# Altium footprint library MyPcbLib.PcbLib: 657 footprints (part 12 of 42)
Each footprint in its own frame and in the unit in brackets; x right, y up, seen from the top. Pads: shape width x height; smd on the part's side, far side on the other; paste and mask are expansions set on the pad; w line width, h text height; cw(c..) or ccw(c..) is an arc to the next point about the centre after c.
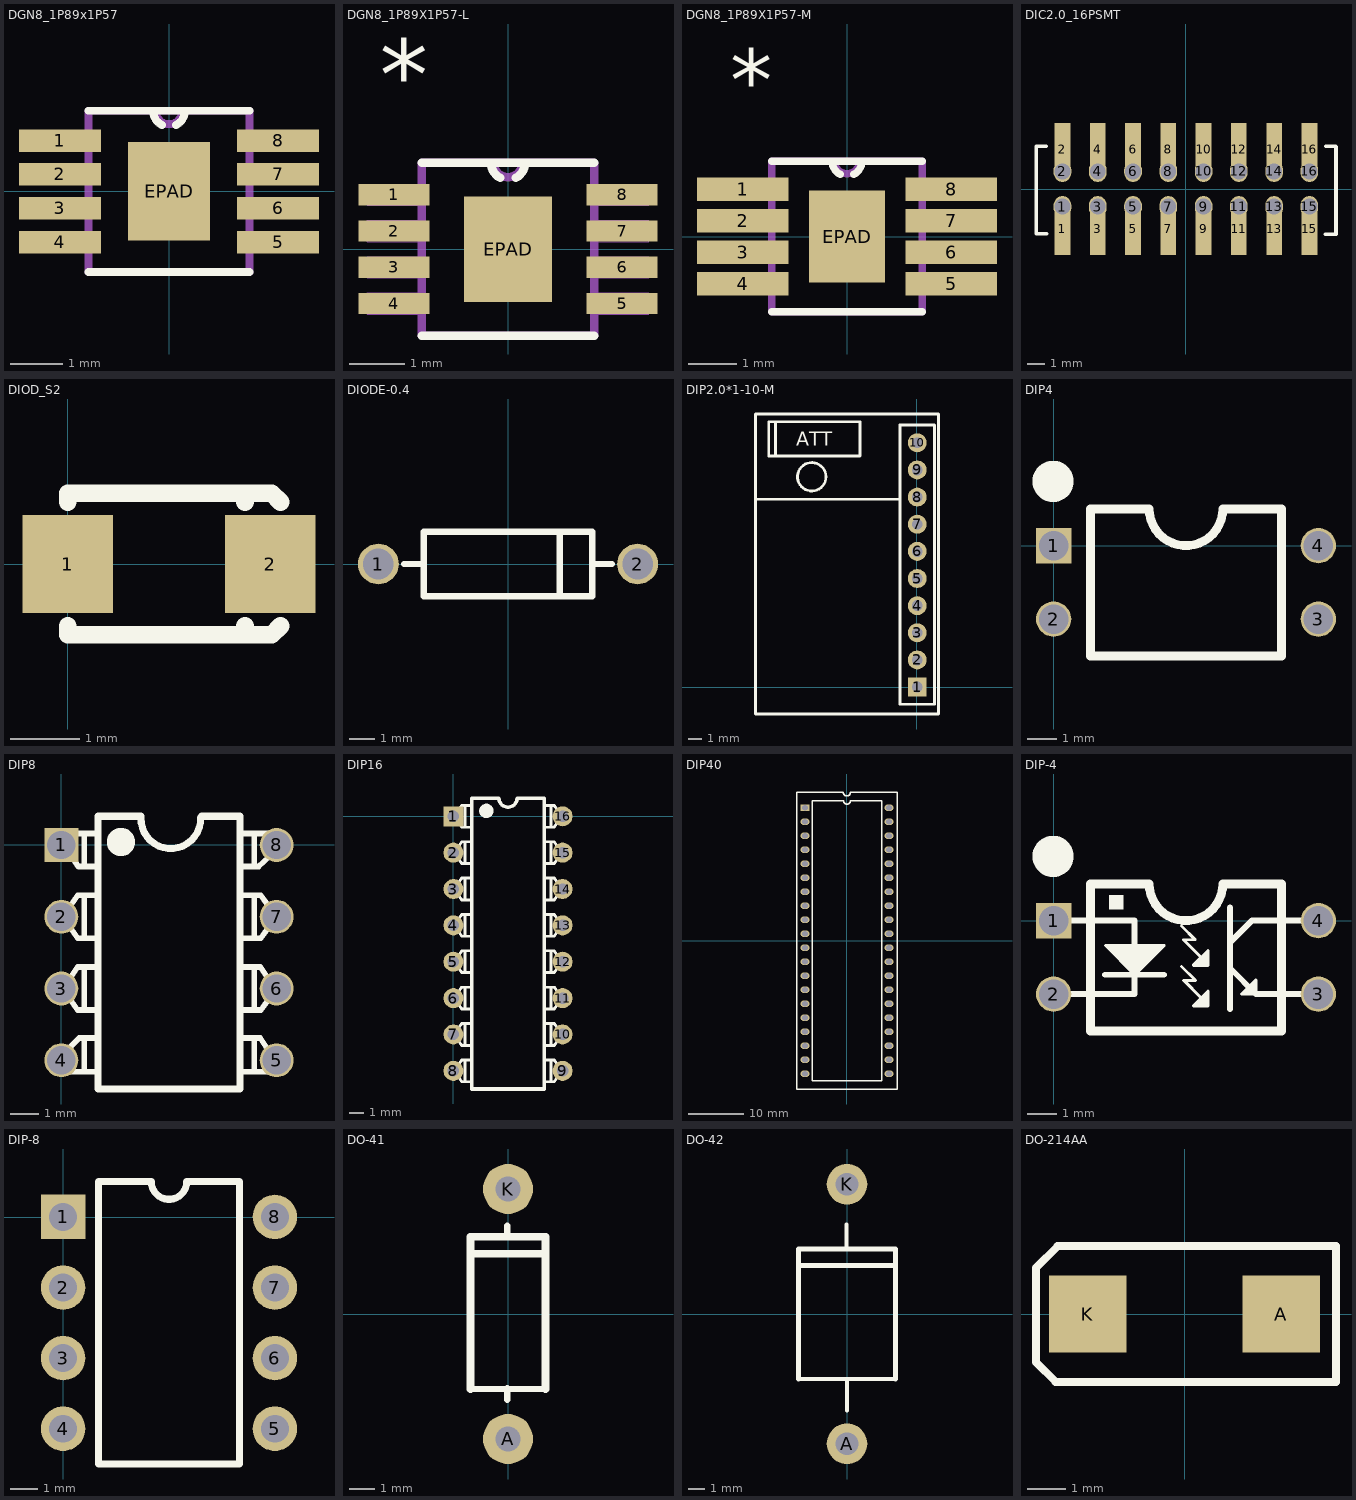
[diagram p11: the footprints below, top view; thin cyan lines are the x and y axes]

## DGN8_1P89x1P57 [mil]
height 43
pads (9):
  rect 62x17 smd: 1(-82.5,38.39) 2(-82.5,12.8) 3(-82.5,-12.8) 4(-82.5,-38.39) 5(82.5,-38.39) 6(82.5,-12.8) 7(82.5,12.8) 8(82.5,38.39)
  rect 61.81x74.41 smd paste-36.7: EPAD(0,0)
Top Overlay:
  lines w6: -61,-61 61,-61 ; -61,61 61,61 ; -12,61 ccw(c0,61) -5.44,50.3 ; 5.44,50.3 ccw(c0,61) 12,61
Top Paste:
  region: 30.91,37.2 -30.91,37.2 -30.91,-37.2 30.91,-37.2
Mechanical 1:
  lines w0: -12,61 ccw(c0,61) 12,61 ; -99.5,-45.89 -99.5,-30.89 -61,-30.89 -61,-45.89 -99.5,-45.89 ; -99.5,-20.3 -99.5,-5.3 -61,-5.3 -61,-20.3 -99.5,-20.3 ; -99.5,5.3 -99.5,20.3 -61,20.3 -61,5.3 -99.5,5.3 ; -99.5,30.89 -99.5,45.89 -61,45.89 -61,30.89 -99.5,30.89 ; -61,-61 61,-61 61,61 -61,61 -61,-61 ; 61,-45.89 61,-30.89 99.5,-30.89 99.5,-45.89 61,-45.89 ; 61,-20.3 61,-5.3 99.5,-5.3 99.5,-20.3 61,-20.3 ; 61,5.3 61,20.3 99.5,20.3 99.5,5.3 61,5.3 ; 61,30.89 61,45.89 99.5,45.89 99.5,30.89 61,30.89
  lines w6: -10.17,61 ccw(c0,61) 10.17,61 ; -61,-61 -61,61 61,61 61,-61 -61,-61

## DGN8_1P89X1P57-L [mil]
height 43
pads (9):
  rect 50x15 smd: 1(-80.5,38.39) 2(-80.5,12.8) 3(-80.5,-12.8) 4(-80.5,-38.39) 5(80.5,-38.39) 6(80.5,-12.8) 7(80.5,12.8) 8(80.5,38.39)
  rect 61.81x74.41 smd paste-36.7: EPAD(0,0)
Top Overlay:
  lines w6: -61,-61 61,-61 ; -61,61 61,61 ; -12,61 ccw(c0,61) -5.44,50.3 ; 5.44,50.3 ccw(c0,61) 12,61
  text "*" at -90.5,98.39 h50
Top Paste:
  region: 30.91,37.2 -30.91,37.2 -30.91,-37.2 30.91,-37.2
Mechanical 1:
  lines w0: -12,61 ccw(c0,61) 12,61 ; -99.5,-45.89 -99.5,-30.89 -61,-30.89 -61,-45.89 -99.5,-45.89 ; -99.5,-20.3 -99.5,-5.3 -61,-5.3 -61,-20.3 -99.5,-20.3 ; -99.5,5.3 -99.5,20.3 -61,20.3 -61,5.3 -99.5,5.3 ; -99.5,30.89 -99.5,45.89 -61,45.89 -61,30.89 -99.5,30.89 ; -61,-61 61,-61 61,61 -61,61 -61,-61 ; 61,-45.89 61,-30.89 99.5,-30.89 99.5,-45.89 61,-45.89 ; 61,-20.3 61,-5.3 99.5,-5.3 99.5,-20.3 61,-20.3 ; 61,5.3 61,20.3 99.5,20.3 99.5,5.3 61,5.3 ; 61,30.89 61,45.89 99.5,45.89 99.5,30.89 61,30.89
  lines w6: -10.17,61 ccw(c0,61) 10.17,61 ; -61,-61 -61,61 61,61 61,-61 -61,-61
  text "*" at -90.5,98.39 h50
  text "43" at 0,0 h50

## DGN8_1P89X1P57-M [mil]
height 43
pads (9):
  rect 74x19 smd: 1(-84.5,38.39) 2(-84.5,12.8) 3(-84.5,-12.8) 4(-84.5,-38.39) 5(84.5,-38.39) 6(84.5,-12.8) 7(84.5,12.8) 8(84.5,38.39)
  rect 61.81x74.41 smd paste-36.7: EPAD(0,0)
Top Overlay:
  lines w6: -61,-61 61,-61 ; -61,61 61,61 ; -12,61 ccw(c0,61) -5.44,50.3 ; 5.44,50.3 ccw(c0,61) 12,61
  text "*" at -94.5,102.39 h50
Top Paste:
  region: 30.91,37.2 -30.91,37.2 -30.91,-37.2 30.91,-37.2
Mechanical 1:
  lines w0: -12,61 ccw(c0,61) 12,61 ; -99.5,-45.89 -61,-45.89 -61,-30.89 -99.5,-30.89 -99.5,-45.89 ; -99.5,-20.3 -61,-20.3 -61,-5.3 -99.5,-5.3 -99.5,-20.3 ; -99.5,5.3 -61,5.3 -61,20.3 -99.5,20.3 -99.5,5.3 ; -99.5,30.89 -61,30.89 -61,45.89 -99.5,45.89 -99.5,30.89 ; -61,-61 -61,61 61,61 61,-61 -61,-61 ; 61,-45.89 99.5,-45.89 99.5,-30.89 61,-30.89 61,-45.89 ; 61,-20.3 99.5,-20.3 99.5,-5.3 61,-5.3 61,-20.3 ; 61,5.3 99.5,5.3 99.5,20.3 61,20.3 61,5.3 ; 61,30.89 99.5,30.89 99.5,45.89 61,45.89 61,30.89
  lines w6: -10.17,61 ccw(c0,61) 10.17,61 ; -61,-61 61,-61 61,61 -61,61 -61,-61
  text "43" at 0,0 h50
  text "*" at -94.5,102.39 h50

## DIC2.0_16PSMT [mm]
pads (32):
  rect 0.89x3 smd: 1(-7,-2.25) 2(-7,2.25) 3(-5,-2.25) 4(-5,2.25) 5(-3,-2.25) 6(-3,2.25) 7(-1,-2.25) 8(-1,2.25) 9(1,-2.25) 10(1,2.25) 11(3,-2.25) 12(3,2.25) 13(5,-2.25) 14(5,2.25) 15(7,-2.25) 16(7,2.25)
  oval 1x1.2 hole 0.9: 1(-7,-1) 2(-7,1) 3(-5,-1) 4(-5,1) 5(-3,-1) 6(-3,1) 7(-1,-1) 8(-1,1) 9(1,-1) 10(1,1) 11(3,-1) 12(3,1) 13(5,-1) 14(5,1) 15(7,-1) 16(7,1)
Top Overlay:
  lines w0.203: -7.925,2.413 -8.492,2.413 -8.492,-2.54 -7.899,-2.54 ; 7.899,-2.565 8.508,-2.565 8.508,2.389 8.484,2.413 7.925,2.413
3D body: height 4.2, standoff -0.2, extent -8.025,-1.943 7.975,2.057

## DIOD_S2 [mm]
pads (2):
  rect 1.3x1.4 smd: 1(0.004,0) 2(2.904,0)
Top Overlay:
  lines w0.254: 0.004,-0.889 0.004,-1.016 2.925,-1.016 3.052,-0.889 ; 0.004,0.889 0.004,1.016 2.925,1.016 3.052,0.889 ; 2.544,-1.016 2.544,-0.889 ; 2.544,0.889 2.544,1.016

## DIODE-0.4 [mm] "Diode, Thru-Hole; 2 Leads; 0.4 in Pin Spacing"
height 2.54
pads (2):
  round 1.6 hole 1.2: 1(-5.08,0) 2(5.08,0)
Top Overlay:
  lines w0.254: -4.064,0 -3.302,0 ; 2.032,-1.27 2.032,1.27 ; 3.302,0 4.064,0 ; -3.302,-1.27 -3.302,1.27 3.302,1.27 3.302,-1.27 -3.302,-1.27
3D body: height 3.26, standoff -2, extent -5.207,-1.168 5.553,1.352

## DIP2.0*1-10-M [mil]
pads (10):
  rect 55x55 hole 31.5: 1(1,0)
  round 55 hole 31.5: 2(1,78.74) 3(1,157.48) 4(1,236.22) 5(1,314.96) 6(1,393.7) 7(1,472.44) 8(1,551.18) 9(1,629.92) 10(1,708.66)
Top Overlay:
  circle w7.87: c-305,610 r41.23
  lines w8: -461.31,545 -50,545 -50,760 ; -415,770 -410,770 -410,670 ; -468.5,-78 63,-78 63,792.14 -468.5,792.14 -468.5,-78 ; -430,670 -430,770 -165,770 -165,670 -430,670 ; -49,-50 51,-50 51,760 -49,760 -49,-50
  text "ATT" at -350,700 h40

## DIP4 [mm]
pads (4):
  rect 1.2x1.2 / inner rect 1.2x1.2 / far side rect 2x1.5 hole 1: 1(0,0)
  round 1.2 / inner round 1.2 / far side oval 2x1.5 hole 1: 2(0,-2.5) 3(9,-2.5) 4(9,0)
Top Overlay:
  circle w1: c-0.022,2.184 r0.2
  lines w0.3: 1.25,-3.75 7.75,-3.75 7.75,1.25 5.75,1.25 cw(c4.5,1.25) 3.25,1.25 1.25,1.25 1.25,-3.75

## DIP8 [mm]
pads (8):
  rect 1.2x1.2 / inner rect 1.2x1.2 / far side rect 2.5x1.8 hole 1: 1(0,0)
  round 1.2 / inner round 1.2 / far side oval 2.5x1.8 hole 1: 2(0,-2.54) 3(0,-5.08) 4(0,-7.62) 5(7.62,-7.62) 6(7.62,-5.08) 7(7.62,-2.54) 8(7.62,0)
Top Overlay:
  circle w0.6: c2.107,0.105 r0.2
  lines w0.2: 0.813,-7.976 0.813,-6.934 ; 0.813,-5.791 0.813,-4.343 ; 0.813,-3.302 0.813,-1.854 ; 0.813,-0.711 0.813,0.33 ; 1.168,-8.026 0,-8.026 0,-7.214 0.254,-7.214 0.635,-6.833 1.194,-6.833 ; 1.168,-4.318 0.584,-4.318 0.33,-4.674 0,-4.674 0,-5.486 0.33,-5.486 0.584,-5.842 1.194,-5.842 ; 1.168,-1.778 0.584,-1.778 0.33,-2.134 0,-2.134 0,-2.946 0.33,-2.946 0.584,-3.302 1.194,-3.302 ; 1.194,-0.762 0.61,-0.762 0.356,-0.406 0,-0.406 0,0.406 1.194,0.406 ; 6.401,-1.778 7.061,-1.778 7.315,-2.134 7.645,-2.134 7.645,-2.946 7.315,-2.946 7.061,-3.302 6.452,-3.302 ; 6.426,-8.026 7.645,-8.026 7.645,-7.214 7.29,-7.214 7.036,-6.833 6.452,-6.833 ; 6.452,-5.842 7.061,-5.842 7.315,-5.486 7.595,-5.486 7.595,-4.674 7.29,-4.674 7.036,-4.318 6.452,-4.318 ; 6.452,-0.762 6.985,-0.762 7.366,-0.406 7.645,-0.406 7.645,0.406 6.452,0.406 ; 6.833,-7.976 6.833,-6.909 ; 6.833,-5.74 6.833,-4.42 ; 6.833,-3.226 6.833,-1.854 ; 6.833,-0.686 6.833,0.33
  lines w0.25: 2.819,0.965 ccw(c3.873,0.927) 4.928,0.965 ; 2.819,1.016 1.295,1.016 1.295,-8.636 6.325,-8.636 6.325,1.016 4.953,1.016

## DIP16 [mm]
pads (16):
  rect 1.4x1.4 / inner rect 1.4x1.4 / far side rect 2.2x1.4 hole 0.8: 1(0,0)
  round 1.4 / inner round 1.4 / far side oval 2.2x1.4 hole 0.8: 2(0,-2.54) 3(0,-5.08) 4(0,-7.62) 5(0,-10.16) 6(0,-12.7) 7(0,-15.24) 8(0,-17.78) 9(7.62,-17.78) 10(7.62,-15.24) 11(7.62,-12.7) 12(7.62,-10.16) 13(7.62,-7.62) 14(7.62,-5.08) 15(7.62,-2.54) 16(7.62,0)
Top Overlay:
  circle w0.6: c2.3,0.375 r0.2
  lines w0.2: 0.813,-18.542 0.813,-17.094 ; 0.813,-16.002 0.813,-14.554 ; 0.813,-13.462 0.813,-12.014 ; 0.813,-10.922 0.813,-9.474 ; 0.813,-8.382 0.813,-6.934 ; 0.813,-5.842 0.813,-4.394 ; 0.813,-3.302 0.813,-1.854 ; 0.813,-0.762 0.813,0.686 ; 1.168,-17.018 0.584,-17.018 0.33,-17.374 0,-17.374 0,-18.186 0.33,-18.186 0.584,-18.542 1.194,-18.542 ; 1.168,-14.478 0.584,-14.478 0.33,-14.834 0,-14.834 0,-15.646 0.33,-15.646 0.584,-16.002 1.194,-16.002 ; 1.168,-11.938 0.584,-11.938 0.33,-12.294 0,-12.294 0,-13.106 0.33,-13.106 0.584,-13.462 1.194,-13.462 ; 1.168,-9.398 0.584,-9.398 0.33,-9.754 0,-9.754 0,-10.566 0.33,-10.566 0.584,-10.922 1.194,-10.922 ; 1.168,-6.858 0.584,-6.858 0.33,-7.214 0,-7.214 0,-8.026 0.33,-8.026 0.584,-8.382 1.194,-8.382 ; 1.168,-4.318 0.584,-4.318 0.33,-4.674 0,-4.674 0,-5.486 0.33,-5.486 0.584,-5.842 1.194,-5.842 ; 1.168,-1.778 0.584,-1.778 0.33,-2.134 0,-2.134 0,-2.946 0.33,-2.946 0.584,-3.302 1.194,-3.302 ; 1.168,0.762 0.584,0.762 0.33,0.406 0,0.406 0,-0.406 0.33,-0.406 0.584,-0.762 1.194,-0.762 ; 6.426,-18.542 7.036,-18.542 7.29,-18.186 7.62,-18.186 7.62,-17.374 7.29,-17.374 7.036,-17.018 6.452,-17.018 ; 6.426,-16.002 7.036,-16.002 7.29,-15.646 7.62,-15.646 7.62,-14.834 7.29,-14.834 7.036,-14.478 6.452,-14.478 ; 6.426,-13.462 7.036,-13.462 7.29,-13.106 7.62,-13.106 7.62,-12.294 7.29,-12.294 7.036,-11.938 6.452,-11.938 ; 6.426,-10.922 7.036,-10.922 7.29,-10.566 7.62,-10.566 7.62,-9.754 7.29,-9.754 7.036,-9.398 6.452,-9.398 ; 6.426,-8.382 7.036,-8.382 7.29,-8.026 7.62,-8.026 7.62,-7.214 7.29,-7.214 7.036,-6.858 6.452,-6.858 ; 6.426,-5.842 7.036,-5.842 7.29,-5.486 7.62,-5.486 7.62,-4.674 7.29,-4.674 7.036,-4.318 6.452,-4.318 ; 6.426,-3.302 7.036,-3.302 7.29,-2.946 7.62,-2.946 7.62,-2.134 7.29,-2.134 7.036,-1.778 6.452,-1.778 ; 6.426,-0.762 7.036,-0.762 7.29,-0.406 7.62,-0.406 7.62,0.406 7.29,0.406 7.036,0.762 6.452,0.762 ; 6.807,-18.542 6.807,-17.094 ; 6.807,-16.002 6.807,-14.554 ; 6.807,-13.462 6.807,-12.014 ; 6.807,-10.922 6.807,-9.474 ; 6.807,-8.382 6.807,-6.934 ; 6.807,-5.842 6.807,-4.394 ; 6.807,-3.302 6.807,-1.854 ; 6.807,-0.762 6.807,0.686
  lines w0.254: 1.27,-19.05 6.35,-19.05 6.35,1.27 4.445,1.27 cw(c3.81,1.27) 3.175,1.27 1.27,1.27 1.27,-19.05

## DIP40 [mm]
pads (40):
  rect 1.6x1.2 hole 1: 1(-7.62,24.13)
  oval 1.6x1.2 hole 1: 2(-7.62,21.59) 3(-7.62,19.05) 4(-7.62,16.51) 5(-7.62,13.97) 6(-7.62,11.43) 7(-7.62,8.89) 8(-7.62,6.35) 9(-7.62,3.81) 10(-7.62,1.27) 11(-7.62,-1.27) 12(-7.62,-3.81) 13(-7.62,-6.35) 14(-7.62,-8.89) 15(-7.62,-11.43) 16(-7.62,-13.97) 17(-7.62,-16.51) 18(-7.62,-19.05) 19(-7.62,-21.59) 20(-7.62,-24.13) 21(7.62,-24.13) 22(7.62,-21.59) 23(7.62,-19.05) 24(7.62,-16.51) 25(7.62,-13.97) 26(7.62,-11.43) 27(7.62,-8.89) 28(7.62,-6.35) 29(7.62,-3.81) 30(7.62,-1.27) 31(7.62,1.27) 32(7.62,3.81) 33(7.62,6.35) 34(7.62,8.89) 35(7.62,11.43) 36(7.62,13.97) 37(7.62,16.51) 38(7.62,19.05) 39(7.62,21.59) 40(7.62,24.13)
Top Overlay:
  lines w0.254: -9.12,-26.9 -9.12,26.9 -0.66,26.9 ccw(c-0.025,26.9) 0.61,26.9 9.12,26.9 9.12,-26.9 -9.12,-26.9 ; -6.35,-25.4 6.35,-25.4 6.35,25.4 0.635,25.4 cw(c0,25.4) -0.635,25.4 -6.35,25.4 -6.35,-25.4
3D body: height 4.8, standoff -2, extent -7.619,-26.549 7.621,25.521

## DIP-4 [mm]
pads (4):
  rect 1.2x1.2 / inner rect 1.2x1.2 / far side rect 2x1.5 hole 1: 1(0,0)
  round 1.2 / inner round 1.2 / far side oval 2x1.5 hole 1: 2(0,-2.5) 3(9,-2.5) 4(9,0)
Top Overlay:
  circle w1: c-0.022,2.184 r0.2
  region: 2.375,0.875 1.875,0.875 1.875,0.375 2.375,0.375
  region: 5.205,-1.2 4.985,-1.2 4.985,-1.48 5.205,-1.48
  region: 5.015,-1.34 4.865,-1.34 4.865,-1.51 5.015,-1.51
  region: 5.225,-1.12 5.125,-1.12 5.125,-1.25 5.225,-1.25
  region: 6.78,-2.36 6.51,-2.36 6.51,-2.47 6.78,-2.47
  region: 6.86,-2.26 6.6,-2.26 6.6,-2.4 6.86,-2.4
  region: 6.87,-2.17 6.7,-2.17 6.7,-2.28 6.87,-2.28
  region: 6.87,-2.12 6.76,-2.12 6.76,-2.19 6.87,-2.19
  region: 3.03,-0.85 2.46,-0.85 2.46,-1.54 3.03,-1.54
  region: 3.37,-0.85 2.09,-0.85 2.09,-1.2 3.37,-1.2
  region: 2.89,-1.51 2.65,-1.51 2.65,-1.69 2.89,-1.69
  region: 2.87,-0.95 2.73,-0.95 2.73,-1.79 2.87,-1.79
  region: 3.17,-0.97 2.3,-0.97 2.3,-1.41 3.17,-1.41
  region: 3.53,-0.8 1.96,-0.8 1.96,-1.07 3.53,-1.07
  region: 5.21,-2.58 4.99,-2.58 4.99,-2.86 5.21,-2.86
  region: 5.02,-2.72 4.87,-2.72 4.87,-2.89 5.02,-2.89
  region: 5.23,-2.5 5.13,-2.5 5.13,-2.63 5.23,-2.63
  lines w0.1: 4.345,-0.18 4.815,-0.65 4.415,-0.65 5.015,-1.25 ; 4.35,-1.56 4.82,-2.03 4.42,-2.03 5.02,-2.63 ; 5.99,-1.63 6.01,-1.63 ; 5.99,-1.01 5.99,-0.77 ; 6.868,-2.488 6.856,-2.5 6.394,-2.5 6.88,-2.014 6.88,-2.5 ; 1.76,-0.84 3.76,-0.84 2.76,-1.84 1.76,-0.84 ; 4.75,-1.52 5.25,-1.52 5.25,-1.015 4.75,-1.515 4.75,-1.52 ; 4.755,-2.9 5.255,-2.9 5.255,-2.395 4.755,-2.895 4.755,-2.9
  lines w0.15: 1.94,-0.89 2.74,-1.69
  lines w0.2: -0.25,-2.5 2.75,-2.5 2.75,-1.85 ; -0.25,0 2.75,0 2.75,-0.84 ; 1.75,-1.84 3.75,-1.84 ; 2.77,-1.73 3.61,-0.89 ; 5.99,-3.01 5.99,0.45 ; 5.99,-0.75 6.74,0 9.25,0 ; 6.01,-1.63 6.88,-2.5 9.25,-2.5
  lines w0.3: 1.25,-3.75 7.75,-3.75 7.75,1.25 5.75,1.25 cw(c4.5,1.25) 3.25,1.25 1.25,1.25 1.25,-3.75

## DIP-8 [mm]
pads (8):
  rect 1.6x1.6 hole 1: 1(-0.004,0.003)
  round 1.6 hole 1: 2(-0.004,-2.537) 3(-0.004,-5.077) 4(-0.004,-7.617) 5(7.616,-7.617) 6(7.616,-5.077) 7(7.616,-2.537) 8(7.616,0.003)
Top Overlay:
  lines w0.254: 1.266,-8.887 1.266,1.273 3.171,1.273 ccw(c3.806,1.273) 4.441,1.273 6.346,1.273 6.346,-8.887 1.266,-8.887
3D body: height 4.95, standoff -2.35, extent -0.381,-8.763 7.874,1.397

## DO-41 [mm] "1N4007"
pads (2):
  round 2 hole 1: A(0,-5) K(0,5)
Top Overlay:
  lines w0.254: -1.5,-3 1.5,-3 ; -0.025,-3.429 -0.025,-2.972 ; -0.025,3.175 -0.025,3.531
  lines w0.305: -1.5,-3 -1.5,3.092 1.5,3.092 1.5,-3 ; -1.448,2.413 1.473,2.413

## DO-42 [mm] "1N4007"
pads (2):
  round 2.5 hole 1.4: A(0,-8) K(0,8)
Top Overlay:
  lines w0.254: -3,-4 3,-4 ; -0.025,4 -0.025,5.512 ; 0,-5.944 0,-4
  lines w0.305: -3,-4 -3,4 3,4 3,-4 ; -3,3 3,3

## DO-214AA [mm]
pads (2):
  rect 2x2 smd: A(2.5,0) K(-2.5,0)
Top Overlay:
  lines w0.203: -3.835,-1.245 -3.327,-1.753 3.912,-1.753 3.912,1.753 -3.277,1.753 -3.835,1.194 -3.835,-1.245
3D body: height 2.45, standoff 0.03, extent -2.623,-1.747 2.877,2.153